# Altium schematic symbol library jlcpcb_2025_04_capacitors_extended_1206.schlib: 2503 symbols (part 5 of 14)
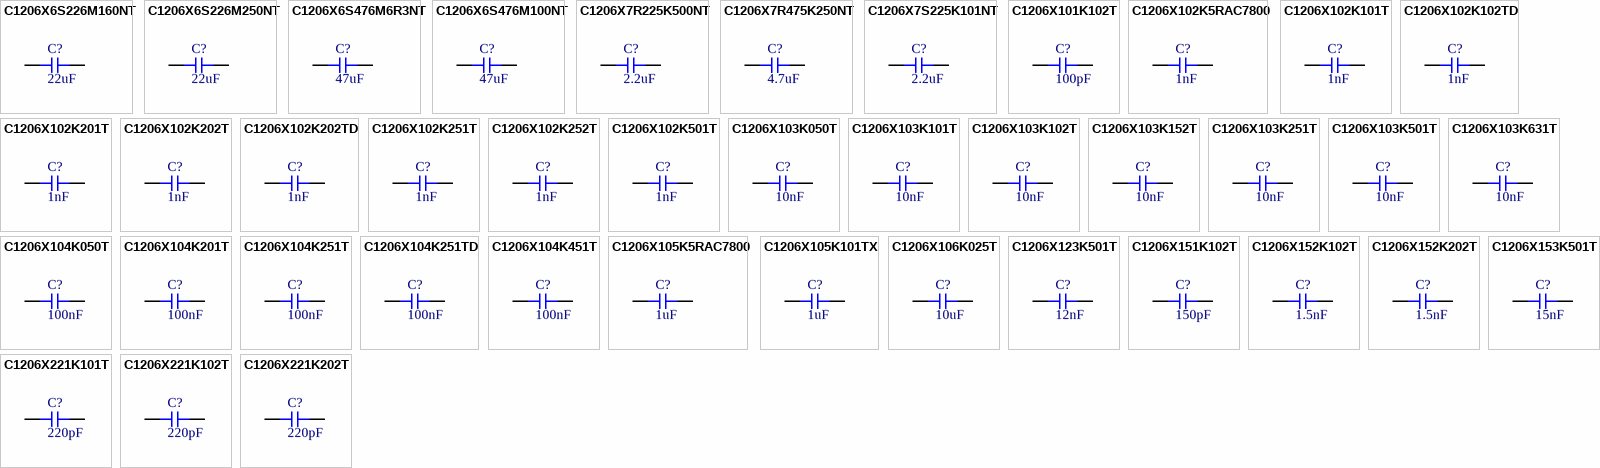
[diagram p66: symbols C1206X6S226M160NT to C1206X221K202T]

## C1206X6S476M6R3NT
designator C?  Capacitance: 47uF  (hidden comment: *)
Capacitor, Ceramic (MLCC), 47uF, ±20%, 6.3V, ±20%, SMD 1206; Manufacturer: SANYEAR; Manufacturer Part Number: C1206X6S476M6R3NT; Package Size: 1206; JLCPCB Basic Part: No; JLCPCB Part Number: C2844314; Supplier 1: LCSC; Category: Capacitors - MLCC; Supplier Part Number 1: C2844314; Tolerance: ±20%; Voltage Rating: 6.3V; RoHS: Yes; ComponentLink1Description: Datasheet; ComponentLink1URL: https://wmsc.lcsc.com/wmsc/upload/file/pdf/v2/lcsc/2304140030_SANYEAR-C1206X6S476M6R3NT_C2844314.pdf; ComponentLink2Description: JLCPCB Part URL; ComponentLink2URL: https://jlcpcb.com/partdetail/C2844314; ComponentLink3Description: LCSC Part URL; ComponentLink3URL: https://lcsc.com/product-detail/Multilayer-Ceramic-Capacitors-MLCC---SMD-SMT_SANYEAR-SANYEAR-C1206X6S476M6R3NT_C2844314.html
footprint CAP-1206 (1206 (3216M) Capacitor)
pins: 1, 2

## C1206X6S476M100NT
designator C?  Capacitance: 47uF  (hidden comment: *)
Capacitor, Ceramic (MLCC), 47uF, ±20%, 10V, ±20%, SMD 1206; Manufacturer: SANYEAR; Manufacturer Part Number: C1206X6S476M100NT; Package Size: 1206; JLCPCB Basic Part: No; JLCPCB Part Number: C2844313; Supplier 1: LCSC; Category: Capacitors - MLCC; Supplier Part Number 1: C2844313; Tolerance: ±20%; Voltage Rating: 10V; RoHS: Yes; ComponentLink1Description: Datasheet; ComponentLink1URL: https://wmsc.lcsc.com/wmsc/upload/file/pdf/v2/lcsc/2304140030_SANYEAR-C1206X6S476M100NT_C2844313.pdf; ComponentLink2Description: JLCPCB Part URL; ComponentLink2URL: https://jlcpcb.com/partdetail/C2844313; ComponentLink3Description: LCSC Part URL; ComponentLink3URL: https://lcsc.com/product-detail/Multilayer-Ceramic-Capacitors-MLCC---SMD-SMT_SANYEAR-SANYEAR-C1206X6S476M100NT_C2844313.html
footprint CAP-1206 (1206 (3216M) Capacitor)
pins: 1, 2

## C1206X7R225K500NT
designator C?  Capacitance: 2.2uF  (hidden comment: *)
Capacitor, Ceramic (MLCC), 2.2uF, ±10%, 50V, X7R, ±10%, SMD 1206; Manufacturer: SANYEAR; Manufacturer Part Number: C1206X7R225K500NT; Package Size: 1206; JLCPCB Basic Part: No; JLCPCB Part Number: C729467; Supplier 1: LCSC; Category: Capacitors - MLCC; Supplier Part Number 1: C729467; Tolerance: ±10%; Voltage Rating: 50V; Temperature Coefficient: X7R; RoHS: Yes; ComponentLink1Description: Datasheet; ComponentLink1URL: https://wmsc.lcsc.com/wmsc/upload/file/pdf/v2/lcsc/2304140030_SANYEAR-C1206X7R225K500NT_C729467.pdf; ComponentLink2Description: JLCPCB Part URL; ComponentLink2URL: https://jlcpcb.com/partdetail/C729467; ComponentLink3Description: LCSC Part URL; ComponentLink3URL: https://lcsc.com/product-detail/Multilayer-Ceramic-Capacitors-MLCC---SMD-SMT_SANYEAR-SANYEAR-C1206X7R225K500NT_C729467.html
footprint CAP-1206 (1206 (3216M) Capacitor)
pins: 1, 2

## C1206X7R475K250NT
designator C?  Capacitance: 4.7uF  (hidden comment: *)
Capacitor, Ceramic (MLCC), 4.7uF, ±10%, 25V, ±10%, SMD 1206; Manufacturer: SANYEAR; Manufacturer Part Number: C1206X7R475K250NT; Package Size: 1206; JLCPCB Basic Part: No; JLCPCB Part Number: C466804; Supplier 1: LCSC; Category: Capacitors - MLCC; Supplier Part Number 1: C466804; Tolerance: ±10%; Voltage Rating: 25V; RoHS: Yes; ComponentLink1Description: Datasheet; ComponentLink1URL: https://wmsc.lcsc.com/wmsc/upload/file/pdf/v2/lcsc/2304140030_SANYEAR-C1206X7R475K250NT_C466804.pdf; ComponentLink2Description: JLCPCB Part URL; ComponentLink2URL: https://jlcpcb.com/partdetail/C466804; ComponentLink3Description: LCSC Part URL; ComponentLink3URL: https://lcsc.com/product-detail/Multilayer-Ceramic-Capacitors-MLCC---SMD-SMT_SANYEAR-SANYEAR-C1206X7R475K250NT_C466804.html
footprint CAP-1206 (1206 (3216M) Capacitor)
pins: 1, 2

## C1206X7S225K101NT
designator C?  Capacitance: 2.2uF  (hidden comment: *)
Capacitor, Ceramic (MLCC), 2.2uF, ±10%, 100V, X7S, ±10%, SMD 1206; Manufacturer: SANYEAR; Manufacturer Part Number: C1206X7S225K101NT; Package Size: 1206; JLCPCB Basic Part: No; JLCPCB Part Number: C2859187; Supplier 1: LCSC; Category: Capacitors - MLCC; Supplier Part Number 1: C2859187; Tolerance: ±10%; Voltage Rating: 100V; Temperature Coefficient: X7S; RoHS: Yes; ComponentLink1Description: Datasheet; ComponentLink1URL: https://wmsc.lcsc.com/wmsc/upload/file/pdf/v2/lcsc/2108170930_SANYEAR-C1206X7S225K101NT_C2859187.pdf; ComponentLink2Description: JLCPCB Part URL; ComponentLink2URL: https://jlcpcb.com/partdetail/C2859187; ComponentLink3Description: LCSC Part URL; ComponentLink3URL: https://lcsc.com/product-detail/Multilayer-Ceramic-Capacitors-MLCC---SMD-SMT_SANYEAR-SANYEAR-C1206X7S225K101NT_C2859187.html
footprint CAP-1206 (1206 (3216M) Capacitor)
pins: 1, 2

## C1206X101K102T
designator C?  Capacitance: 100pF  (hidden comment: *)
Capacitor, Ceramic (MLCC), 100pF, ±10%, 1kV, X7R, ±10%, SMD 1206; Manufacturer: IHHEC(HOLY STONE ENTERPRISE CO., LTD); Manufacturer Part Number: C1206X101K102T; Package Size: 1206; JLCPCB Basic Part: No; JLCPCB Part Number: C480251; Supplier 1: LCSC; Category: Capacitors - MLCC; Supplier Part Number 1: C480251; Tolerance: ±10%; Voltage Rating: 1kV; Temperature Coefficient: X7R; RoHS: Yes; ComponentLink1Description: Datasheet; ComponentLink1URL: https://wmsc.lcsc.com/wmsc/upload/file/pdf/v2/lcsc/2304140030_IHHEC-HOLY-STONE-ENTERPRISE-CO---LTD-C1206X101K102T_C480251.pdf; ComponentLink2Description: JLCPCB Part URL; ComponentLink2URL: https://jlcpcb.com/partdetail/C480251; ComponentLink3Description: LCSC Part URL; ComponentLink3URL: https://lcsc.com/product-detail/Multilayer-Ceramic-Capacitors-MLCC---SMD-SMT_IHHECHOLY-STONE-ENTERPRISE-CO.%2C-LTD-IHHECHOLY-STONE-ENTERPRISE-CO.%2C-LTD-C1206X101K102T_C480251.html
footprint CAP-1206 (1206 (3216M) Capacitor)
pins: 1, 2

## C1206X102K5RAC7800
designator C?  Capacitance: 1nF  (hidden comment: *)
Capacitor, Ceramic (MLCC), 1nF, ±10%, 50V, X7R, ±10%, SMD 1206; Manufacturer: KEMET; Manufacturer Part Number: C1206X102K5RAC7800; Package Size: 1206; JLCPCB Basic Part: No; JLCPCB Part Number: C141211; Supplier 1: LCSC; Category: Capacitors - MLCC; Supplier Part Number 1: C141211; Tolerance: ±10%; Voltage Rating: 50V; Temperature Coefficient: X7R; RoHS: Yes; ComponentLink1Description: Datasheet; ComponentLink1URL: https://wmsc.lcsc.com/wmsc/upload/file/pdf/v2/lcsc/2304140030_KEMET-C1206X102K5RAC7800_C141211.pdf; ComponentLink2Description: JLCPCB Part URL; ComponentLink2URL: https://jlcpcb.com/partdetail/C141211; ComponentLink3Description: LCSC Part URL; ComponentLink3URL: https://lcsc.com/product-detail/Multilayer-Ceramic-Capacitors-MLCC---SMD-SMT_KEMET-KEMET-C1206X102K5RAC7800_C141211.html
footprint CAP-1206 (1206 (3216M) Capacitor)
pins: 1, 2

## C1206X102K101T
designator C?  Capacitance: 1nF  (hidden comment: *)
Capacitor, Ceramic (MLCC), 1nF, ±10%, 100V, X7R, ±10%, SMD 1206; Manufacturer: IHHEC(HOLY STONE ENTERPRISE CO., LTD); Manufacturer Part Number: C1206X102K101T; Package Size: 1206; JLCPCB Basic Part: No; JLCPCB Part Number: C398254; Supplier 1: LCSC; Category: Capacitors - MLCC; Supplier Part Number 1: C398254; Tolerance: ±10%; Voltage Rating: 100V; Temperature Coefficient: X7R; RoHS: Yes; ComponentLink1Description: Datasheet; ComponentLink1URL: https://wmsc.lcsc.com/wmsc/upload/file/pdf/v2/lcsc/2304140030_IHHEC-HOLY-STONE-ENTERPRISE-CO---LTD-C1206X102K101T_C398254.pdf; ComponentLink2Description: JLCPCB Part URL; ComponentLink2URL: https://jlcpcb.com/partdetail/C398254; ComponentLink3Description: LCSC Part URL; ComponentLink3URL: https://lcsc.com/product-detail/Multilayer-Ceramic-Capacitors-MLCC---SMD-SMT_IHHECHOLY-STONE-ENTERPRISE-CO.%2C-LTD-IHHECHOLY-STONE-ENTERPRISE-CO.%2C-LTD-C1206X102K101T_C398254.html
footprint CAP-1206 (1206 (3216M) Capacitor)
pins: 1, 2

## C1206X102K102TD
designator C?  Capacitance: 1nF  (hidden comment: *)
Capacitor, Ceramic (MLCC), 1nF, ±10%, 1kV, X7R, ±10%, SMD 1206; Manufacturer: IHHEC(HOLY STONE ENTERPRISE CO., LTD); Manufacturer Part Number: C1206X102K102TD; Package Size: 1206; JLCPCB Basic Part: No; JLCPCB Part Number: C559296; Supplier 1: LCSC; Category: Capacitors - MLCC; Supplier Part Number 1: C559296; Tolerance: ±10%; Voltage Rating: 1kV; Temperature Coefficient: X7R; RoHS: Yes; ComponentLink1Description: Datasheet; ComponentLink1URL: https://wmsc.lcsc.com/wmsc/upload/file/pdf/v2/lcsc/2304140030_IHHEC-HOLY-STONE-ENTERPRISE-CO---LTD-C1206X102K102TD_C559296.pdf; ComponentLink2Description: JLCPCB Part URL; ComponentLink2URL: https://jlcpcb.com/partdetail/C559296; ComponentLink3Description: LCSC Part URL; ComponentLink3URL: https://lcsc.com/product-detail/Multilayer-Ceramic-Capacitors-MLCC---SMD-SMT_IHHECHOLY-STONE-ENTERPRISE-CO.%2C-LTD-IHHECHOLY-STONE-ENTERPRISE-CO.%2C-LTD-C1206X102K102TD_C559296.html
footprint CAP-1206 (1206 (3216M) Capacitor)
pins: 1, 2

## C1206X102K201T
designator C?  Capacitance: 1nF  (hidden comment: *)
Capacitor, Ceramic (MLCC), 1nF, ±10%, 200V, X7R, ±10%, SMD 1206; Manufacturer: IHHEC(HOLY STONE ENTERPRISE CO., LTD); Manufacturer Part Number: C1206X102K201T; Package Size: 1206; JLCPCB Basic Part: No; JLCPCB Part Number: C106011; Supplier 1: LCSC; Category: Capacitors - MLCC; Supplier Part Number 1: C106011; Tolerance: ±10%; Voltage Rating: 200V; Temperature Coefficient: X7R; RoHS: Yes; ComponentLink1Description: Datasheet; ComponentLink1URL: https://wmsc.lcsc.com/wmsc/upload/file/pdf/v2/lcsc/2304140030_IHHEC-HOLY-STONE-ENTERPRISE-CO---LTD-C1206X102K201T_C106011.pdf; ComponentLink2Description: JLCPCB Part URL; ComponentLink2URL: https://jlcpcb.com/partdetail/C106011; ComponentLink3Description: LCSC Part URL; ComponentLink3URL: https://lcsc.com/product-detail/Multilayer-Ceramic-Capacitors-MLCC---SMD-SMT_IHHECHOLY-STONE-ENTERPRISE-CO.%2C-LTD-IHHECHOLY-STONE-ENTERPRISE-CO.%2C-LTD-C1206X102K201T_C106011.html
footprint CAP-1206 (1206 (3216M) Capacitor)
pins: 1, 2

## C1206X102K202T
designator C?  Capacitance: 1nF  (hidden comment: *)
Capacitor, Ceramic (MLCC), 1nF, ±10%, 2kV, X7R, ±10%, SMD 1206; Manufacturer: IHHEC(HOLY STONE ENTERPRISE CO., LTD); Manufacturer Part Number: C1206X102K202T; Package Size: 1206; JLCPCB Basic Part: No; JLCPCB Part Number: C106012; Supplier 1: LCSC; Category: Capacitors - MLCC; Supplier Part Number 1: C106012; Tolerance: ±10%; Voltage Rating: 2kV; Temperature Coefficient: X7R; RoHS: Yes; ComponentLink1Description: Datasheet; ComponentLink1URL: https://wmsc.lcsc.com/wmsc/upload/file/pdf/v2/lcsc/2304140030_IHHEC-HOLY-STONE-ENTERPRISE-CO---LTD-C1206X102K202T_C106012.pdf; ComponentLink2Description: JLCPCB Part URL; ComponentLink2URL: https://jlcpcb.com/partdetail/C106012; ComponentLink3Description: LCSC Part URL; ComponentLink3URL: https://lcsc.com/product-detail/Multilayer-Ceramic-Capacitors-MLCC---SMD-SMT_IHHECHOLY-STONE-ENTERPRISE-CO.%2C-LTD-IHHECHOLY-STONE-ENTERPRISE-CO.%2C-LTD-C1206X102K202T_C106012.html
footprint CAP-1206 (1206 (3216M) Capacitor)
pins: 1, 2

## C1206X102K202TD
designator C?  Capacitance: 1nF  (hidden comment: *)
Capacitor, Ceramic (MLCC), 1nF, ±10%, 2kV, X7R, ±10%, SMD 1206; Manufacturer: IHHEC(HOLY STONE ENTERPRISE CO., LTD); Manufacturer Part Number: C1206X102K202TD; Package Size: 1206; JLCPCB Basic Part: No; JLCPCB Part Number: C559283; Supplier 1: LCSC; Category: Capacitors - MLCC; Supplier Part Number 1: C559283; Tolerance: ±10%; Voltage Rating: 2kV; Temperature Coefficient: X7R; RoHS: Yes; ComponentLink1Description: Datasheet; ComponentLink1URL: https://wmsc.lcsc.com/wmsc/upload/file/pdf/v2/lcsc/2304140030_IHHEC-HOLY-STONE-ENTERPRISE-CO---LTD-C1206X102K202TD_C559283.pdf; ComponentLink2Description: JLCPCB Part URL; ComponentLink2URL: https://jlcpcb.com/partdetail/C559283; ComponentLink3Description: LCSC Part URL; ComponentLink3URL: https://lcsc.com/product-detail/Multilayer-Ceramic-Capacitors-MLCC---SMD-SMT_IHHECHOLY-STONE-ENTERPRISE-CO.%2C-LTD-IHHECHOLY-STONE-ENTERPRISE-CO.%2C-LTD-C1206X102K202TD_C559283.html
footprint CAP-1206 (1206 (3216M) Capacitor)
pins: 1, 2

## C1206X102K251T
designator C?  Capacitance: 1nF  (hidden comment: *)
Capacitor, Ceramic (MLCC), 1nF, ±10%, 250V, X7R, ±10%, SMD 1206; Manufacturer: IHHEC(HOLY STONE ENTERPRISE CO., LTD); Manufacturer Part Number: C1206X102K251T; Package Size: 1206; JLCPCB Basic Part: No; JLCPCB Part Number: C106014; Supplier 1: LCSC; Category: Capacitors - MLCC; Supplier Part Number 1: C106014; Tolerance: ±10%; Voltage Rating: 250V; Temperature Coefficient: X7R; RoHS: Yes; ComponentLink1Description: Datasheet; ComponentLink1URL: https://wmsc.lcsc.com/wmsc/upload/file/pdf/v2/lcsc/2304140030_IHHEC-HOLY-STONE-ENTERPRISE-CO---LTD-C1206X102K251T_C106014.pdf; ComponentLink2Description: JLCPCB Part URL; ComponentLink2URL: https://jlcpcb.com/partdetail/C106014; ComponentLink3Description: LCSC Part URL; ComponentLink3URL: https://lcsc.com/product-detail/Multilayer-Ceramic-Capacitors-MLCC---SMD-SMT_IHHECHOLY-STONE-ENTERPRISE-CO.%2C-LTD-IHHECHOLY-STONE-ENTERPRISE-CO.%2C-LTD-C1206X102K251T_C106014.html
footprint CAP-1206 (1206 (3216M) Capacitor)
pins: 1, 2

## C1206X102K252T
designator C?  Capacitance: 1nF  (hidden comment: *)
Capacitor, Ceramic (MLCC), 1nF, ±10%, 2.5kV, X7R, ±10%, SMD 1206; Manufacturer: IHHEC(HOLY STONE ENTERPRISE CO., LTD); Manufacturer Part Number: C1206X102K252T; Package Size: 1206; JLCPCB Basic Part: No; JLCPCB Part Number: C2915759; Supplier 1: LCSC; Category: Capacitors - MLCC; Supplier Part Number 1: C2915759; Tolerance: ±10%; Voltage Rating: 2.5kV; Temperature Coefficient: X7R; RoHS: Yes; ComponentLink1Description: Datasheet; ComponentLink1URL: https://wmsc.lcsc.com/wmsc/upload/file/pdf/v2/lcsc/2111172030_IHHEC-HOLY-STONE-ENTERPRISE-CO---LTD-C1206X102K252T_C2915759.pdf; ComponentLink2Description: JLCPCB Part URL; ComponentLink2URL: https://jlcpcb.com/partdetail/C2915759; ComponentLink3Description: LCSC Part URL; ComponentLink3URL: https://lcsc.com/product-detail/Multilayer-Ceramic-Capacitors-MLCC---SMD-SMT_IHHECHOLY-STONE-ENTERPRISE-CO.%2C-LTD-IHHECHOLY-STONE-ENTERPRISE-CO.%2C-LTD-C1206X102K252T_C2915759.html
footprint CAP-1206 (1206 (3216M) Capacitor)
pins: 1, 2

## C1206X102K501T
designator C?  Capacitance: 1nF  (hidden comment: *)
Capacitor, Ceramic (MLCC), 1nF, ±10%, 500V, X7R, ±10%, SMD 1206; Manufacturer: IHHEC(HOLY STONE ENTERPRISE CO., LTD); Manufacturer Part Number: C1206X102K501T; Package Size: 1206; JLCPCB Basic Part: No; JLCPCB Part Number: C106015; Supplier 1: LCSC; Category: Capacitors - MLCC; Supplier Part Number 1: C106015; Tolerance: ±10%; Voltage Rating: 500V; Temperature Coefficient: X7R; RoHS: Yes; ComponentLink1Description: Datasheet; ComponentLink1URL: https://wmsc.lcsc.com/wmsc/upload/file/pdf/v2/lcsc/2304140030_IHHEC-HOLY-STONE-ENTERPRISE-CO---LTD-C1206X102K501T_C106015.pdf; ComponentLink2Description: JLCPCB Part URL; ComponentLink2URL: https://jlcpcb.com/partdetail/C106015; ComponentLink3Description: LCSC Part URL; ComponentLink3URL: https://lcsc.com/product-detail/Multilayer-Ceramic-Capacitors-MLCC---SMD-SMT_IHHECHOLY-STONE-ENTERPRISE-CO.%2C-LTD-IHHECHOLY-STONE-ENTERPRISE-CO.%2C-LTD-C1206X102K501T_C106015.html
footprint CAP-1206 (1206 (3216M) Capacitor)
pins: 1, 2

## C1206X103K050T
designator C?  Capacitance: 10nF  (hidden comment: *)
Capacitor, Ceramic (MLCC), 10nF, ±10%, 50V, X7R, ±10%, SMD 1206; Manufacturer: IHHEC(HOLY STONE ENTERPRISE CO., LTD); Manufacturer Part Number: C1206X103K050T; Package Size: 1206; JLCPCB Basic Part: No; JLCPCB Part Number: C106016; Supplier 1: LCSC; Category: Capacitors - MLCC; Supplier Part Number 1: C106016; Tolerance: ±10%; Voltage Rating: 50V; Temperature Coefficient: X7R; RoHS: Yes; ComponentLink1Description: Datasheet; ComponentLink1URL: https://wmsc.lcsc.com/wmsc/upload/file/pdf/v2/lcsc/2304140030_IHHEC-HOLY-STONE-ENTERPRISE-CO---LTD-C1206X103K050T_C106016.pdf; ComponentLink2Description: JLCPCB Part URL; ComponentLink2URL: https://jlcpcb.com/partdetail/C106016; ComponentLink3Description: LCSC Part URL; ComponentLink3URL: https://lcsc.com/product-detail/Multilayer-Ceramic-Capacitors-MLCC---SMD-SMT_IHHECHOLY-STONE-ENTERPRISE-CO.%2C-LTD-IHHECHOLY-STONE-ENTERPRISE-CO.%2C-LTD-C1206X103K050T_C106016.html
footprint CAP-1206 (1206 (3216M) Capacitor)
pins: 1, 2

## C1206X103K101T
designator C?  Capacitance: 10nF  (hidden comment: *)
Capacitor, Ceramic (MLCC), 10nF, ±10%, 100V, X7R, ±10%, SMD 1206; Manufacturer: IHHEC(HOLY STONE ENTERPRISE CO., LTD); Manufacturer Part Number: C1206X103K101T; Package Size: 1206; JLCPCB Basic Part: No; JLCPCB Part Number: C106017; Supplier 1: LCSC; Category: Capacitors - MLCC; Supplier Part Number 1: C106017; Tolerance: ±10%; Voltage Rating: 100V; Temperature Coefficient: X7R; RoHS: Yes; ComponentLink1Description: Datasheet; ComponentLink1URL: https://wmsc.lcsc.com/wmsc/upload/file/pdf/v2/lcsc/2304140030_IHHEC-HOLY-STONE-ENTERPRISE-CO---LTD-C1206X103K101T_C106017.pdf; ComponentLink2Description: JLCPCB Part URL; ComponentLink2URL: https://jlcpcb.com/partdetail/C106017; ComponentLink3Description: LCSC Part URL; ComponentLink3URL: https://lcsc.com/product-detail/Multilayer-Ceramic-Capacitors-MLCC---SMD-SMT_IHHECHOLY-STONE-ENTERPRISE-CO.%2C-LTD-IHHECHOLY-STONE-ENTERPRISE-CO.%2C-LTD-C1206X103K101T_C106017.html
footprint CAP-1206 (1206 (3216M) Capacitor)
pins: 1, 2

## C1206X103K102T
designator C?  Capacitance: 10nF  (hidden comment: *)
Capacitor, Ceramic (MLCC), 10nF, ±10%, 1kV, X7R, ±10%, SMD 1206; Manufacturer: IHHEC(HOLY STONE ENTERPRISE CO., LTD); Manufacturer Part Number: C1206X103K102T; Package Size: 1206; JLCPCB Basic Part: No; JLCPCB Part Number: C106018; Supplier 1: LCSC; Category: Capacitors - MLCC; Supplier Part Number 1: C106018; Tolerance: ±10%; Voltage Rating: 1kV; Temperature Coefficient: X7R; RoHS: Yes; ComponentLink1Description: Datasheet; ComponentLink1URL: https://wmsc.lcsc.com/wmsc/upload/file/pdf/v2/lcsc/2304140030_IHHEC-HOLY-STONE-ENTERPRISE-CO---LTD-C1206X103K102T_C106018.pdf; ComponentLink2Description: JLCPCB Part URL; ComponentLink2URL: https://jlcpcb.com/partdetail/C106018; ComponentLink3Description: LCSC Part URL; ComponentLink3URL: https://lcsc.com/product-detail/Multilayer-Ceramic-Capacitors-MLCC---SMD-SMT_IHHECHOLY-STONE-ENTERPRISE-CO.%2C-LTD-IHHECHOLY-STONE-ENTERPRISE-CO.%2C-LTD-C1206X103K102T_C106018.html
footprint CAP-1206 (1206 (3216M) Capacitor)
pins: 1, 2

## C1206X103K152T
designator C?  Capacitance: 10nF  (hidden comment: *)
Capacitor, Ceramic (MLCC), 10nF, ±10%, 1.5kV, ±10%, SMD 1206; Manufacturer: IHHEC(HOLY STONE ENTERPRISE CO., LTD); Manufacturer Part Number: C1206X103K152T; Package Size: 1206; JLCPCB Basic Part: No; JLCPCB Part Number: C962381; Supplier 1: LCSC; Category: Capacitors - MLCC; Supplier Part Number 1: C962381; Tolerance: ±10%; Voltage Rating: 1.5kV; RoHS: Yes; ComponentLink1Description: Datasheet; ComponentLink1URL: https://wmsc.lcsc.com/wmsc/upload/file/pdf/v2/lcsc/2304140030_IHHEC-HOLY-STONE-ENTERPRISE-CO---LTD-C1206X103K152T_C962381.pdf; ComponentLink2Description: JLCPCB Part URL; ComponentLink2URL: https://jlcpcb.com/partdetail/C962381; ComponentLink3Description: LCSC Part URL; ComponentLink3URL: https://lcsc.com/product-detail/Multilayer-Ceramic-Capacitors-MLCC---SMD-SMT_IHHECHOLY-STONE-ENTERPRISE-CO.%2C-LTD-IHHECHOLY-STONE-ENTERPRISE-CO.%2C-LTD-C1206X103K152T_C962381.html
footprint CAP-1206 (1206 (3216M) Capacitor)
pins: 1, 2

## C1206X103K251T
designator C?  Capacitance: 10nF  (hidden comment: *)
Capacitor, Ceramic (MLCC), 10nF, ±10%, 250V, X7R, ±10%, SMD 1206; Manufacturer: IHHEC(HOLY STONE ENTERPRISE CO., LTD); Manufacturer Part Number: C1206X103K251T; Package Size: 1206; JLCPCB Basic Part: No; JLCPCB Part Number: C106021; Supplier 1: LCSC; Category: Capacitors - MLCC; Supplier Part Number 1: C106021; Tolerance: ±10%; Voltage Rating: 250V; Temperature Coefficient: X7R; RoHS: Yes; ComponentLink1Description: Datasheet; ComponentLink1URL: https://wmsc.lcsc.com/wmsc/upload/file/pdf/v2/lcsc/2304140030_IHHEC-HOLY-STONE-ENTERPRISE-CO---LTD-C1206X103K251T_C106021.pdf; ComponentLink2Description: JLCPCB Part URL; ComponentLink2URL: https://jlcpcb.com/partdetail/C106021; ComponentLink3Description: LCSC Part URL; ComponentLink3URL: https://lcsc.com/product-detail/Multilayer-Ceramic-Capacitors-MLCC---SMD-SMT_IHHECHOLY-STONE-ENTERPRISE-CO.%2C-LTD-IHHECHOLY-STONE-ENTERPRISE-CO.%2C-LTD-C1206X103K251T_C106021.html
footprint CAP-1206 (1206 (3216M) Capacitor)
pins: 1, 2

## C1206X103K501T
designator C?  Capacitance: 10nF  (hidden comment: *)
Capacitor, Ceramic (MLCC), 10nF, ±10%, 500V, X7R, ±10%, SMD 1206; Manufacturer: IHHEC(HOLY STONE ENTERPRISE CO., LTD); Manufacturer Part Number: C1206X103K501T; Package Size: 1206; JLCPCB Basic Part: No; JLCPCB Part Number: C106022; Supplier 1: LCSC; Category: Capacitors - MLCC; Supplier Part Number 1: C106022; Tolerance: ±10%; Voltage Rating: 500V; Temperature Coefficient: X7R; RoHS: Yes; ComponentLink1Description: Datasheet; ComponentLink1URL: https://wmsc.lcsc.com/wmsc/upload/file/pdf/v2/lcsc/2304140030_IHHEC-HOLY-STONE-ENTERPRISE-CO---LTD-C1206X103K501T_C106022.pdf; ComponentLink2Description: JLCPCB Part URL; ComponentLink2URL: https://jlcpcb.com/partdetail/C106022; ComponentLink3Description: LCSC Part URL; ComponentLink3URL: https://lcsc.com/product-detail/Multilayer-Ceramic-Capacitors-MLCC---SMD-SMT_IHHECHOLY-STONE-ENTERPRISE-CO.%2C-LTD-IHHECHOLY-STONE-ENTERPRISE-CO.%2C-LTD-C1206X103K501T_C106022.html
footprint CAP-1206 (1206 (3216M) Capacitor)
pins: 1, 2

## C1206X103K631T
designator C?  Capacitance: 10nF  (hidden comment: *)
Capacitor, Ceramic (MLCC), 10nF, ±10%, 630V, X7R, ±10%, SMD 1206; Manufacturer: IHHEC(HOLY STONE ENTERPRISE CO., LTD); Manufacturer Part Number: C1206X103K631T; Package Size: 1206; JLCPCB Basic Part: No; JLCPCB Part Number: C337974; Supplier 1: LCSC; Category: Capacitors - MLCC; Supplier Part Number 1: C337974; Tolerance: ±10%; Voltage Rating: 630V; Temperature Coefficient: X7R; RoHS: Yes; ComponentLink1Description: Datasheet; ComponentLink1URL: https://wmsc.lcsc.com/wmsc/upload/file/pdf/v2/lcsc/1912111437_IHHEC-HOLY-STONE-ENTERPRISE-CO---LTD-C1206X103K631T_C337974.pdf; ComponentLink2Description: JLCPCB Part URL; ComponentLink2URL: https://jlcpcb.com/partdetail/C337974; ComponentLink3Description: LCSC Part URL; ComponentLink3URL: https://lcsc.com/product-detail/Multilayer-Ceramic-Capacitors-MLCC---SMD-SMT_IHHECHOLY-STONE-ENTERPRISE-CO.%2C-LTD-IHHECHOLY-STONE-ENTERPRISE-CO.%2C-LTD-C1206X103K631T_C337974.html
footprint CAP-1206 (1206 (3216M) Capacitor)
pins: 1, 2

## C1206X104K050T
designator C?  Capacitance: 100nF  (hidden comment: *)
Capacitor, Ceramic (MLCC), 100nF, ±10%, 50V, X7R, ±10%, SMD 1206; Manufacturer: IHHEC(HOLY STONE ENTERPRISE CO., LTD); Manufacturer Part Number: C1206X104K050T; Package Size: 1206; JLCPCB Basic Part: No; JLCPCB Part Number: C398257; Supplier 1: LCSC; Category: Capacitors - MLCC; Supplier Part Number 1: C398257; Tolerance: ±10%; Voltage Rating: 50V; Temperature Coefficient: X7R; RoHS: Yes; ComponentLink1Description: Datasheet; ComponentLink1URL: https://wmsc.lcsc.com/wmsc/upload/file/pdf/v2/lcsc/2304140030_IHHEC-HOLY-STONE-ENTERPRISE-CO---LTD-C1206X104K050T_C398257.pdf; ComponentLink2Description: JLCPCB Part URL; ComponentLink2URL: https://jlcpcb.com/partdetail/C398257; ComponentLink3Description: LCSC Part URL; ComponentLink3URL: https://lcsc.com/product-detail/Multilayer-Ceramic-Capacitors-MLCC---SMD-SMT_IHHECHOLY-STONE-ENTERPRISE-CO.%2C-LTD-IHHECHOLY-STONE-ENTERPRISE-CO.%2C-LTD-C1206X104K050T_C398257.html
footprint CAP-1206 (1206 (3216M) Capacitor)
pins: 1, 2

## C1206X104K201T
designator C?  Capacitance: 100nF  (hidden comment: *)
Capacitor, Ceramic (MLCC), 100nF, ±10%, 200V, X7R, ±10%, SMD 1206; Manufacturer: IHHEC(HOLY STONE ENTERPRISE CO., LTD); Manufacturer Part Number: C1206X104K201T; Package Size: 1206; JLCPCB Basic Part: No; JLCPCB Part Number: C559293; Supplier 1: LCSC; Category: Capacitors - MLCC; Supplier Part Number 1: C559293; Tolerance: ±10%; Voltage Rating: 200V; Temperature Coefficient: X7R; RoHS: Yes; ComponentLink1Description: Datasheet; ComponentLink1URL: https://wmsc.lcsc.com/wmsc/upload/file/pdf/v2/lcsc/2304140030_IHHEC-HOLY-STONE-ENTERPRISE-CO---LTD-C1206X104K201T_C559293.pdf; ComponentLink2Description: JLCPCB Part URL; ComponentLink2URL: https://jlcpcb.com/partdetail/C559293; ComponentLink3Description: LCSC Part URL; ComponentLink3URL: https://lcsc.com/product-detail/Multilayer-Ceramic-Capacitors-MLCC---SMD-SMT_IHHECHOLY-STONE-ENTERPRISE-CO.%2C-LTD-IHHECHOLY-STONE-ENTERPRISE-CO.%2C-LTD-C1206X104K201T_C559293.html
footprint CAP-1206 (1206 (3216M) Capacitor)
pins: 1, 2

## C1206X104K251T
designator C?  Capacitance: 100nF  (hidden comment: *)
Capacitor, Ceramic (MLCC), 100nF, ±10%, 250V, X7R, ±10%, SMD 1206; Manufacturer: IHHEC(HOLY STONE ENTERPRISE CO., LTD); Manufacturer Part Number: C1206X104K251T; Package Size: 1206; JLCPCB Basic Part: No; JLCPCB Part Number: C106024; Supplier 1: LCSC; Category: Capacitors - MLCC; Supplier Part Number 1: C106024; Tolerance: ±10%; Voltage Rating: 250V; Temperature Coefficient: X7R; RoHS: Yes; ComponentLink1Description: Datasheet; ComponentLink1URL: https://wmsc.lcsc.com/wmsc/upload/file/pdf/v2/lcsc/2407021508_IHHEC-HOLY-STONE-ENTERPRISE-CO---LTD-C1206X104K251T_C106024.pdf; ComponentLink2Description: JLCPCB Part URL; ComponentLink2URL: https://jlcpcb.com/partdetail/C106024; ComponentLink3Description: LCSC Part URL; ComponentLink3URL: https://lcsc.com/product-detail/Multilayer-Ceramic-Capacitors-MLCC---SMD-SMT_IHHECHOLY-STONE-ENTERPRISE-CO.%2C-LTD-IHHECHOLY-STONE-ENTERPRISE-CO.%2C-LTD-C1206X104K251T_C106024.html
footprint CAP-1206 (1206 (3216M) Capacitor)
pins: 1, 2

## C1206X104K251TD
designator C?  Capacitance: 100nF  (hidden comment: *)
Capacitor, Ceramic (MLCC), 100nF, ±10%, 250V, X7R, ±10%, SMD 1206; Manufacturer: IHHEC(HOLY STONE ENTERPRISE CO., LTD); Manufacturer Part Number: C1206X104K251TD; Package Size: 1206; JLCPCB Basic Part: No; JLCPCB Part Number: C559294; Supplier 1: LCSC; Category: Capacitors - MLCC; Supplier Part Number 1: C559294; Tolerance: ±10%; Voltage Rating: 250V; Temperature Coefficient: X7R; RoHS: Yes; ComponentLink1Description: Datasheet; ComponentLink1URL: https://wmsc.lcsc.com/wmsc/upload/file/pdf/v2/lcsc/2304140030_IHHEC-HOLY-STONE-ENTERPRISE-CO---LTD-C1206X104K251TD_C559294.pdf; ComponentLink2Description: JLCPCB Part URL; ComponentLink2URL: https://jlcpcb.com/partdetail/C559294; ComponentLink3Description: LCSC Part URL; ComponentLink3URL: https://lcsc.com/product-detail/Multilayer-Ceramic-Capacitors-MLCC---SMD-SMT_IHHECHOLY-STONE-ENTERPRISE-CO.%2C-LTD-IHHECHOLY-STONE-ENTERPRISE-CO.%2C-LTD-C1206X104K251TD_C559294.html
footprint CAP-1206 (1206 (3216M) Capacitor)
pins: 1, 2

## C1206X104K451T
designator C?  Capacitance: 100nF  (hidden comment: *)
Capacitor, Ceramic (MLCC), 100nF, ±10%, 450V, X7R, ±10%, SMD 1206; Manufacturer: IHHEC(HOLY STONE ENTERPRISE CO., LTD); Manufacturer Part Number: C1206X104K451T; Package Size: 1206; JLCPCB Basic Part: No; JLCPCB Part Number: C106025; Supplier 1: LCSC; Category: Capacitors - MLCC; Supplier Part Number 1: C106025; Tolerance: ±10%; Voltage Rating: 450V; Temperature Coefficient: X7R; RoHS: Yes; ComponentLink1Description: Datasheet; ComponentLink1URL: https://wmsc.lcsc.com/wmsc/upload/file/pdf/v2/lcsc/2304140030_IHHEC-HOLY-STONE-ENTERPRISE-CO---LTD-C1206X104K451T_C106025.pdf; ComponentLink2Description: JLCPCB Part URL; ComponentLink2URL: https://jlcpcb.com/partdetail/C106025; ComponentLink3Description: LCSC Part URL; ComponentLink3URL: https://lcsc.com/product-detail/Multilayer-Ceramic-Capacitors-MLCC---SMD-SMT_IHHECHOLY-STONE-ENTERPRISE-CO.%2C-LTD-IHHECHOLY-STONE-ENTERPRISE-CO.%2C-LTD-C1206X104K451T_C106025.html
footprint CAP-1206 (1206 (3216M) Capacitor)
pins: 1, 2

## C1206X105K5RAC7800
designator C?  Capacitance: 1uF  (hidden comment: *)
Capacitor, Ceramic (MLCC), 1uF, ±10%, 50V, X7R, ±10%, SMD 1206; Manufacturer: KEMET; Manufacturer Part Number: C1206X105K5RAC7800; Package Size: 1206; JLCPCB Basic Part: No; JLCPCB Part Number: C141215; Supplier 1: LCSC; Category: Capacitors - MLCC; Supplier Part Number 1: C141215; Tolerance: ±10%; Voltage Rating: 50V; Temperature Coefficient: X7R; RoHS: Yes; ComponentLink1Description: Datasheet; ComponentLink1URL: https://wmsc.lcsc.com/wmsc/upload/file/pdf/v2/lcsc/2304140030_KEMET-C1206X105K5RAC7800_C141215.pdf; ComponentLink2Description: JLCPCB Part URL; ComponentLink2URL: https://jlcpcb.com/partdetail/C141215; ComponentLink3Description: LCSC Part URL; ComponentLink3URL: https://lcsc.com/product-detail/Multilayer-Ceramic-Capacitors-MLCC---SMD-SMT_KEMET-KEMET-C1206X105K5RAC7800_C141215.html
footprint CAP-1206 (1206 (3216M) Capacitor)
pins: 1, 2

## C1206X105K101TX
designator C?  Capacitance: 1uF  (hidden comment: *)
Capacitor, Ceramic (MLCC), 1uF, ±10%, 100V, X7R, ±10%, SMD 1206; Manufacturer: IHHEC(HOLY STONE ENTERPRISE CO., LTD); Manufacturer Part Number: C1206X105K101TX; Package Size: 1206; JLCPCB Basic Part: No; JLCPCB Part Number: C961521; Supplier 1: LCSC; Category: Capacitors - MLCC; Supplier Part Number 1: C961521; Tolerance: ±10%; Voltage Rating: 100V; Temperature Coefficient: X7R; RoHS: Yes; ComponentLink1Description: Datasheet; ComponentLink1URL: https://wmsc.lcsc.com/wmsc/upload/file/pdf/v2/lcsc/2304140030_IHHEC-HOLY-STONE-ENTERPRISE-CO---LTD-C1206X105K101TX_C961521.pdf; ComponentLink2Description: JLCPCB Part URL; ComponentLink2URL: https://jlcpcb.com/partdetail/C961521; ComponentLink3Description: LCSC Part URL; ComponentLink3URL: https://lcsc.com/product-detail/Multilayer-Ceramic-Capacitors-MLCC---SMD-SMT_IHHECHOLY-STONE-ENTERPRISE-CO.%2C-LTD-IHHECHOLY-STONE-ENTERPRISE-CO.%2C-LTD-C1206X105K101TX_C961521.html
footprint CAP-1206 (1206 (3216M) Capacitor)
pins: 1, 2

## C1206X106K025T
designator C?  Capacitance: 10uF  (hidden comment: *)
Capacitor, Ceramic (MLCC), 10uF, ±10%, 25V, X7R, ±10%, SMD 1206; Manufacturer: IHHEC(HOLY STONE ENTERPRISE CO., LTD); Manufacturer Part Number: C1206X106K025T; Package Size: 1206; JLCPCB Basic Part: No; JLCPCB Part Number: C106027; Supplier 1: LCSC; Category: Capacitors - MLCC; Supplier Part Number 1: C106027; Tolerance: ±10%; Voltage Rating: 25V; Temperature Coefficient: X7R; RoHS: Yes; ComponentLink1Description: Datasheet; ComponentLink1URL: https://wmsc.lcsc.com/wmsc/upload/file/pdf/v2/lcsc/2304140030_IHHEC-HOLY-STONE-ENTERPRISE-CO---LTD-C1206X106K025T_C106027.pdf; ComponentLink2Description: JLCPCB Part URL; ComponentLink2URL: https://jlcpcb.com/partdetail/C106027; ComponentLink3Description: LCSC Part URL; ComponentLink3URL: https://lcsc.com/product-detail/Multilayer-Ceramic-Capacitors-MLCC---SMD-SMT_IHHECHOLY-STONE-ENTERPRISE-CO.%2C-LTD-IHHECHOLY-STONE-ENTERPRISE-CO.%2C-LTD-C1206X106K025T_C106027.html
footprint CAP-1206 (1206 (3216M) Capacitor)
pins: 1, 2

## C1206X123K501T
designator C?  Capacitance: 12nF  (hidden comment: *)
Capacitor, Ceramic (MLCC), 12nF, ±10%, 500V, X7R, ±10%, SMD 1206; Manufacturer: IHHEC(HOLY STONE ENTERPRISE CO., LTD); Manufacturer Part Number: C1206X123K501T; Package Size: 1206; JLCPCB Basic Part: No; JLCPCB Part Number: C106028; Supplier 1: LCSC; Category: Capacitors - MLCC; Supplier Part Number 1: C106028; Tolerance: ±10%; Voltage Rating: 500V; Temperature Coefficient: X7R; RoHS: Yes; ComponentLink1Description: Datasheet; ComponentLink1URL: https://wmsc.lcsc.com/wmsc/upload/file/pdf/v2/lcsc/2304140030_IHHEC-HOLY-STONE-ENTERPRISE-CO---LTD-C1206X123K501T_C106028.pdf; ComponentLink2Description: JLCPCB Part URL; ComponentLink2URL: https://jlcpcb.com/partdetail/C106028; ComponentLink3Description: LCSC Part URL; ComponentLink3URL: https://lcsc.com/product-detail/Multilayer-Ceramic-Capacitors-MLCC---SMD-SMT_IHHECHOLY-STONE-ENTERPRISE-CO.%2C-LTD-IHHECHOLY-STONE-ENTERPRISE-CO.%2C-LTD-C1206X123K501T_C106028.html
footprint CAP-1206 (1206 (3216M) Capacitor)
pins: 1, 2

## C1206X151K102T
designator C?  Capacitance: 150pF  (hidden comment: *)
Capacitor, Ceramic (MLCC), 150pF, ±10%, 1kV, X7R, ±10%, SMD 1206; Manufacturer: IHHEC(HOLY STONE ENTERPRISE CO., LTD); Manufacturer Part Number: C1206X151K102T; Package Size: 1206; JLCPCB Basic Part: No; JLCPCB Part Number: C106029; Supplier 1: LCSC; Category: Capacitors - MLCC; Supplier Part Number 1: C106029; Tolerance: ±10%; Voltage Rating: 1kV; Temperature Coefficient: X7R; RoHS: Yes; ComponentLink1Description: Datasheet; ComponentLink1URL: https://wmsc.lcsc.com/wmsc/upload/file/pdf/v2/lcsc/2304140030_IHHEC-HOLY-STONE-ENTERPRISE-CO---LTD-C1206X151K102T_C106029.pdf; ComponentLink2Description: JLCPCB Part URL; ComponentLink2URL: https://jlcpcb.com/partdetail/C106029; ComponentLink3Description: LCSC Part URL; ComponentLink3URL: https://lcsc.com/product-detail/Multilayer-Ceramic-Capacitors-MLCC---SMD-SMT_IHHECHOLY-STONE-ENTERPRISE-CO.%2C-LTD-IHHECHOLY-STONE-ENTERPRISE-CO.%2C-LTD-C1206X151K102T_C106029.html
footprint CAP-1206 (1206 (3216M) Capacitor)
pins: 1, 2

## C1206X152K102T
designator C?  Capacitance: 1.5nF  (hidden comment: *)
Capacitor, Ceramic (MLCC), 1.5nF, ±10%, 1kV, X7R, ±10%, SMD 1206; Manufacturer: IHHEC(HOLY STONE ENTERPRISE CO., LTD); Manufacturer Part Number: C1206X152K102T; Package Size: 1206; JLCPCB Basic Part: No; JLCPCB Part Number: C106030; Supplier 1: LCSC; Category: Capacitors - MLCC; Supplier Part Number 1: C106030; Tolerance: ±10%; Voltage Rating: 1kV; Temperature Coefficient: X7R; RoHS: Yes; ComponentLink1Description: Datasheet; ComponentLink1URL: https://wmsc.lcsc.com/wmsc/upload/file/pdf/v2/lcsc/2304140030_IHHEC-HOLY-STONE-ENTERPRISE-CO---LTD-C1206X152K102T_C106030.pdf; ComponentLink2Description: JLCPCB Part URL; ComponentLink2URL: https://jlcpcb.com/partdetail/C106030; ComponentLink3Description: LCSC Part URL; ComponentLink3URL: https://lcsc.com/product-detail/Multilayer-Ceramic-Capacitors-MLCC---SMD-SMT_IHHECHOLY-STONE-ENTERPRISE-CO.%2C-LTD-IHHECHOLY-STONE-ENTERPRISE-CO.%2C-LTD-C1206X152K102T_C106030.html
footprint CAP-1206 (1206 (3216M) Capacitor)
pins: 1, 2

## C1206X152K202T
designator C?  Capacitance: 1.5nF  (hidden comment: *)
Capacitor, Ceramic (MLCC), 1.5nF, ±10%, 2kV, X7R, ±10%, SMD 1206; Manufacturer: IHHEC(HOLY STONE ENTERPRISE CO., LTD); Manufacturer Part Number: C1206X152K202T; Package Size: 1206; JLCPCB Basic Part: No; JLCPCB Part Number: C106031; Supplier 1: LCSC; Category: Capacitors - MLCC; Supplier Part Number 1: C106031; Tolerance: ±10%; Voltage Rating: 2kV; Temperature Coefficient: X7R; RoHS: Yes; ComponentLink1Description: Datasheet; ComponentLink1URL: https://wmsc.lcsc.com/wmsc/upload/file/pdf/v2/lcsc/2304140030_IHHEC-HOLY-STONE-ENTERPRISE-CO---LTD-C1206X152K202T_C106031.pdf; ComponentLink2Description: JLCPCB Part URL; ComponentLink2URL: https://jlcpcb.com/partdetail/C106031; ComponentLink3Description: LCSC Part URL; ComponentLink3URL: https://lcsc.com/product-detail/Multilayer-Ceramic-Capacitors-MLCC---SMD-SMT_IHHECHOLY-STONE-ENTERPRISE-CO.%2C-LTD-IHHECHOLY-STONE-ENTERPRISE-CO.%2C-LTD-C1206X152K202T_C106031.html
footprint CAP-1206 (1206 (3216M) Capacitor)
pins: 1, 2

## C1206X153K501T
designator C?  Capacitance: 15nF  (hidden comment: *)
Capacitor, Ceramic (MLCC), 15nF, ±10%, 500V, ±10%, SMD 1206; Manufacturer: IHHEC(HOLY STONE ENTERPRISE CO., LTD); Manufacturer Part Number: C1206X153K501T; Package Size: 1206; JLCPCB Basic Part: No; JLCPCB Part Number: C5257004; Supplier 1: LCSC; Category: Capacitors - MLCC; Supplier Part Number 1: C5257004; Tolerance: ±10%; Voltage Rating: 500V; RoHS: Yes; ComponentLink1Description: Datasheet; ComponentLink1URL: https://wmsc.lcsc.com/wmsc/upload/file/pdf/v2/lcsc/2212022330_IHHEC-HOLY-STONE-ENTERPRISE-CO---LTD-C1206X153K501T_C5257004.pdf; ComponentLink2Description: JLCPCB Part URL; ComponentLink2URL: https://jlcpcb.com/partdetail/C5257004; ComponentLink3Description: LCSC Part URL; ComponentLink3URL: https://lcsc.com/product-detail/Multilayer-Ceramic-Capacitors-MLCC---SMD-SMT_IHHECHOLY-STONE-ENTERPRISE-CO.%2C-LTD-IHHECHOLY-STONE-ENTERPRISE-CO.%2C-LTD-C1206X153K501T_C5257004.html
footprint CAP-1206 (1206 (3216M) Capacitor)
pins: 1, 2

## C1206X221K101T
designator C?  Capacitance: 220pF  (hidden comment: *)
Capacitor, Ceramic (MLCC), 220pF, ±10%, 100V, X7R, ±10%, SMD 1206; Manufacturer: IHHEC(HOLY STONE ENTERPRISE CO., LTD); Manufacturer Part Number: C1206X221K101T; Package Size: 1206; JLCPCB Basic Part: No; JLCPCB Part Number: C106033; Supplier 1: LCSC; Category: Capacitors - MLCC; Supplier Part Number 1: C106033; Tolerance: ±10%; Voltage Rating: 100V; Temperature Coefficient: X7R; RoHS: Yes; ComponentLink1Description: Datasheet; ComponentLink1URL: https://wmsc.lcsc.com/wmsc/upload/file/pdf/v2/lcsc/2304140030_IHHEC-HOLY-STONE-ENTERPRISE-CO---LTD-C1206X221K101T_C106033.pdf; ComponentLink2Description: JLCPCB Part URL; ComponentLink2URL: https://jlcpcb.com/partdetail/C106033; ComponentLink3Description: LCSC Part URL; ComponentLink3URL: https://lcsc.com/product-detail/Multilayer-Ceramic-Capacitors-MLCC---SMD-SMT_IHHECHOLY-STONE-ENTERPRISE-CO.%2C-LTD-IHHECHOLY-STONE-ENTERPRISE-CO.%2C-LTD-C1206X221K101T_C106033.html
footprint CAP-1206 (1206 (3216M) Capacitor)
pins: 1, 2

## C1206X221K102T
designator C?  Capacitance: 220pF  (hidden comment: *)
Capacitor, Ceramic (MLCC), 220pF, ±10%, 1kV, X7R, ±10%, SMD 1206; Manufacturer: IHHEC(HOLY STONE ENTERPRISE CO., LTD); Manufacturer Part Number: C1206X221K102T; Package Size: 1206; JLCPCB Basic Part: No; JLCPCB Part Number: C106034; Supplier 1: LCSC; Category: Capacitors - MLCC; Supplier Part Number 1: C106034; Tolerance: ±10%; Voltage Rating: 1kV; Temperature Coefficient: X7R; RoHS: Yes; ComponentLink1Description: Datasheet; ComponentLink1URL: https://wmsc.lcsc.com/wmsc/upload/file/pdf/v2/lcsc/2304140030_IHHEC-HOLY-STONE-ENTERPRISE-CO---LTD-C1206X221K102T_C106034.pdf; ComponentLink2Description: JLCPCB Part URL; ComponentLink2URL: https://jlcpcb.com/partdetail/C106034; ComponentLink3Description: LCSC Part URL; ComponentLink3URL: https://lcsc.com/product-detail/Multilayer-Ceramic-Capacitors-MLCC---SMD-SMT_IHHECHOLY-STONE-ENTERPRISE-CO.%2C-LTD-IHHECHOLY-STONE-ENTERPRISE-CO.%2C-LTD-C1206X221K102T_C106034.html
footprint CAP-1206 (1206 (3216M) Capacitor)
pins: 1, 2

## C1206X221K202T
designator C?  Capacitance: 220pF  (hidden comment: *)
Capacitor, Ceramic (MLCC), 220pF, ±10%, 2kV, X7R, ±10%, SMD 1206; Manufacturer: IHHEC(HOLY STONE ENTERPRISE CO., LTD); Manufacturer Part Number: C1206X221K202T; Package Size: 1206; JLCPCB Basic Part: No; JLCPCB Part Number: C915828; Supplier 1: LCSC; Category: Capacitors - MLCC; Supplier Part Number 1: C915828; Tolerance: ±10%; Voltage Rating: 2kV; Temperature Coefficient: X7R; RoHS: Yes; ComponentLink1Description: Datasheet; ComponentLink1URL: https://wmsc.lcsc.com/wmsc/upload/file/pdf/v2/lcsc/2304140030_IHHEC-HOLY-STONE-ENTERPRISE-CO---LTD-C1206X221K202T_C915828.pdf; ComponentLink2Description: JLCPCB Part URL; ComponentLink2URL: https://jlcpcb.com/partdetail/C915828; ComponentLink3Description: LCSC Part URL; ComponentLink3URL: https://lcsc.com/product-detail/Multilayer-Ceramic-Capacitors-MLCC---SMD-SMT_IHHECHOLY-STONE-ENTERPRISE-CO.%2C-LTD-IHHECHOLY-STONE-ENTERPRISE-CO.%2C-LTD-C1206X221K202T_C915828.html
footprint CAP-1206 (1206 (3216M) Capacitor)
pins: 1, 2

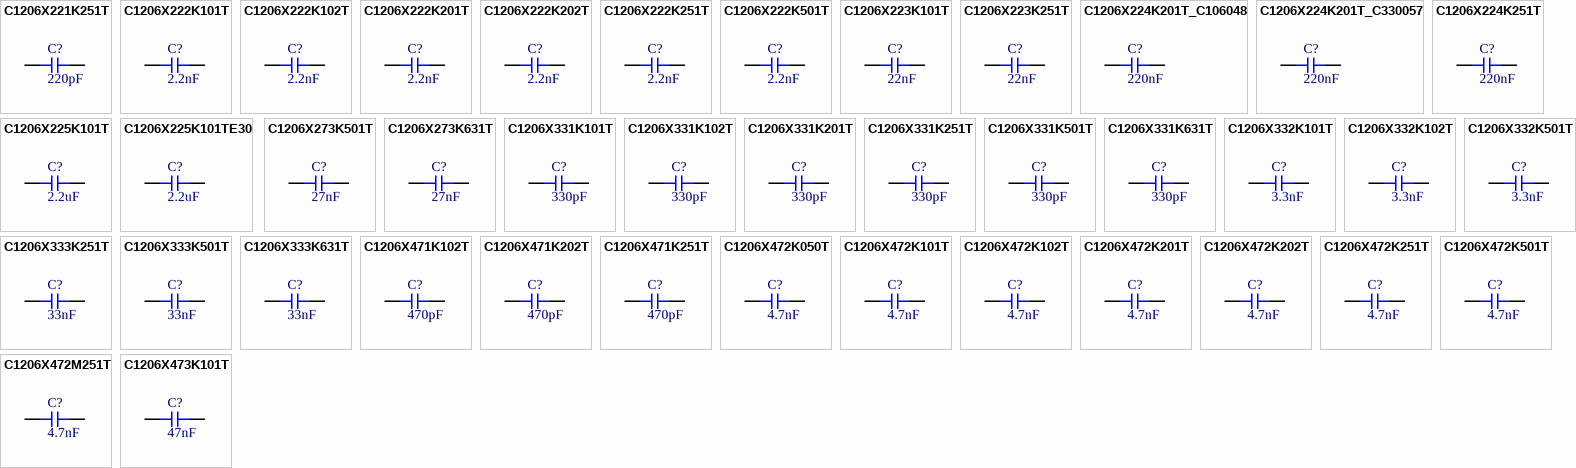
[diagram p19: symbols C1206X221K251T to C1206X473K101T]

## C1206X221K251T
designator C?  Capacitance: 220pF  (hidden comment: *)
Capacitor, Ceramic (MLCC), 220pF, ±10%, 250V, X7R, ±10%, SMD 1206; Manufacturer: IHHEC(HOLY STONE ENTERPRISE CO., LTD); Manufacturer Part Number: C1206X221K251T; Package Size: 1206; JLCPCB Basic Part: No; JLCPCB Part Number: C106035; Supplier 1: LCSC; Category: Capacitors - MLCC; Supplier Part Number 1: C106035; Tolerance: ±10%; Voltage Rating: 250V; Temperature Coefficient: X7R; RoHS: Yes; ComponentLink1Description: Datasheet; ComponentLink1URL: https://wmsc.lcsc.com/wmsc/upload/file/pdf/v2/lcsc/2304140030_IHHEC-HOLY-STONE-ENTERPRISE-CO---LTD-C1206X221K251T_C106035.pdf; ComponentLink2Description: JLCPCB Part URL; ComponentLink2URL: https://jlcpcb.com/partdetail/C106035; ComponentLink3Description: LCSC Part URL; ComponentLink3URL: https://lcsc.com/product-detail/Multilayer-Ceramic-Capacitors-MLCC---SMD-SMT_IHHECHOLY-STONE-ENTERPRISE-CO.%2C-LTD-IHHECHOLY-STONE-ENTERPRISE-CO.%2C-LTD-C1206X221K251T_C106035.html
footprint CAP-1206 (1206 (3216M) Capacitor)
pins: 1, 2

## C1206X222K101T
designator C?  Capacitance: 2.2nF  (hidden comment: *)
Capacitor, Ceramic (MLCC), 2.2nF, ±10%, 100V, X7R, ±10%, SMD 1206; Manufacturer: IHHEC(HOLY STONE ENTERPRISE CO., LTD); Manufacturer Part Number: C1206X222K101T; Package Size: 1206; JLCPCB Basic Part: No; JLCPCB Part Number: C106037; Supplier 1: LCSC; Category: Capacitors - MLCC; Supplier Part Number 1: C106037; Tolerance: ±10%; Voltage Rating: 100V; Temperature Coefficient: X7R; RoHS: Yes; ComponentLink1Description: Datasheet; ComponentLink1URL: https://wmsc.lcsc.com/wmsc/upload/file/pdf/v2/lcsc/2304140030_IHHEC-HOLY-STONE-ENTERPRISE-CO---LTD-C1206X222K101T_C106037.pdf; ComponentLink2Description: JLCPCB Part URL; ComponentLink2URL: https://jlcpcb.com/partdetail/C106037; ComponentLink3Description: LCSC Part URL; ComponentLink3URL: https://lcsc.com/product-detail/Multilayer-Ceramic-Capacitors-MLCC---SMD-SMT_IHHECHOLY-STONE-ENTERPRISE-CO.%2C-LTD-IHHECHOLY-STONE-ENTERPRISE-CO.%2C-LTD-C1206X222K101T_C106037.html
footprint CAP-1206 (1206 (3216M) Capacitor)
pins: 1, 2

## C1206X222K102T
designator C?  Capacitance: 2.2nF  (hidden comment: *)
Capacitor, Ceramic (MLCC), 2.2nF, ±10%, 1kV, X7R, ±10%, SMD 1206; Manufacturer: IHHEC(HOLY STONE ENTERPRISE CO., LTD); Manufacturer Part Number: C1206X222K102T; Package Size: 1206; JLCPCB Basic Part: No; JLCPCB Part Number: C106038; Supplier 1: LCSC; Category: Capacitors - MLCC; Supplier Part Number 1: C106038; Tolerance: ±10%; Voltage Rating: 1kV; Temperature Coefficient: X7R; RoHS: Yes; ComponentLink1Description: Datasheet; ComponentLink1URL: https://wmsc.lcsc.com/wmsc/upload/file/pdf/v2/lcsc/2304140030_IHHEC-HOLY-STONE-ENTERPRISE-CO---LTD-C1206X222K102T_C106038.pdf; ComponentLink2Description: JLCPCB Part URL; ComponentLink2URL: https://jlcpcb.com/partdetail/C106038; ComponentLink3Description: LCSC Part URL; ComponentLink3URL: https://lcsc.com/product-detail/Multilayer-Ceramic-Capacitors-MLCC---SMD-SMT_IHHECHOLY-STONE-ENTERPRISE-CO.%2C-LTD-IHHECHOLY-STONE-ENTERPRISE-CO.%2C-LTD-C1206X222K102T_C106038.html
footprint CAP-1206 (1206 (3216M) Capacitor)
pins: 1, 2
